# Altium footprint library BMS_V2.1_Adv.PcbLib: 66 footprints (part 5 of 5)
Each footprint in its own frame and in the unit in brackets; x right, y up, seen from the top. Pads: shape width x height; smd on the part's side, far side on the other; paste and mask are expansions set on the pad; w line width, h text height; cw(c..) or ccw(c..) is an arc to the next point about the centre after c.
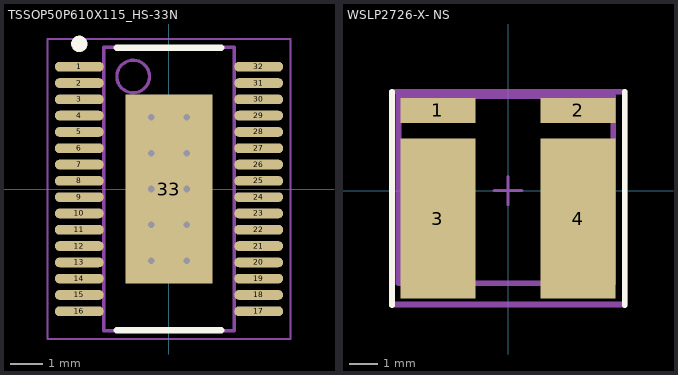
[diagram p4: the footprints below, top view; thin cyan lines are the x and y axes]

## TSSOP50P610X115_HS-33N [mm] "TSSOP, 32-Leads, Body 8.66x3.95mm, Pitch 0.50mm, Thermal Pad 5.80x2.67mm, IPC Medium Density"
height 1.15
pads (33):
  oval 1.5x0.3 smd: 1(-2.75,3.75) 2(-2.75,3.25) 3(-2.75,2.75) 4(-2.75,2.25) 5(-2.75,1.75) 6(-2.75,1.25) 7(-2.75,0.75) 8(-2.75,0.25) 9(-2.75,-0.25) 10(-2.75,-0.75) 11(-2.75,-1.25) 12(-2.75,-1.75) 13(-2.75,-2.25) 14(-2.75,-2.75) 15(-2.75,-3.25) 16(-2.75,-3.75) 17(2.75,-3.75) 18(2.75,-3.25) 19(2.75,-2.75) 20(2.75,-2.25) 21(2.75,-1.75) 22(2.75,-1.25) 23(2.75,-0.75) 24(2.75,-0.25) 25(2.75,0.25) 26(2.75,0.75) 27(2.75,1.25) 28(2.75,1.75) 29(2.75,2.25) 30(2.75,2.75) 31(2.75,3.25) 32(2.75,3.75)
  rect 2.67x5.8 smd: 33(0,0)
via 0.55,-2.2 diameter 0.5 hole 0.2
via -0.55,-2.2 diameter 0.5 hole 0.2
via 0.55,-1.1 diameter 0.5 hole 0.2
via -0.55,-1.1 diameter 0.5 hole 0.2
via 0.55,0 diameter 0.5 hole 0.2
via -0.55,0 diameter 0.5 hole 0.2
via 0.55,1.1 diameter 0.5 hole 0.2
via -0.55,1.1 diameter 0.5 hole 0.2
via 0.55,2.2 diameter 0.5 hole 0.2
via -0.55,2.2 diameter 0.5 hole 0.2
Top Overlay:
  circle w0.25: c-2.75,4.45 r0.125
  lines w0.2: -1.6,-4.325 1.6,-4.325 ; -1.6,4.325 1.6,4.325
Mechanical 13:
  circle w0.1: c-1.1,3.45 r0.5
  lines w0.1: -2,-4.35 2,-4.35 2,4.35 -2,4.35 -2,-4.35
  text ".Designator" at -1.524,0 h0.69
Mechanical 15:
  lines w0.05: -3.725,-4.6 3.725,-4.6 3.725,4.6 -3.725,4.6 -3.725,-4.6
  lines w0.1: -0.5,0 0.5,0 ; 0,-0.5 0,0.5
3D body "PG-TSDSO-32-1_Z8B00190281_V03_3D.stp": height 1.1, standoff -0.05, extent -3.001,-4.325 3,4.325

## WSLP2726-X- NS [mm] "Chip Resistor, Non Standard"
height 3.15
pads (4):
  rect 2.69x0.89 smd: 1(-2.5,2.862) 2(2.5,2.862)
  rect 2.69x5.71 smd: 3(-2.5,-1) 4(2.5,-1)
Top Overlay:
  lines w0.203: -4.14,-4.089 -4.14,3.531 ; 4.166,-4.089 4.166,3.531
Mechanical 13:
  lines w0.203: -3.912,-3.302 -3.912,3.378 3.759,3.378 3.759,-3.302 -3.912,-3.302
  text ".Designator" at 0,0 h0.69
Mechanical 15:
  lines w0.1: -0.5,0 0.5,0 ; 0,-0.5 0,0.5
  lines w0.203: -4.14,-4.064 -4.14,3.531 4.166,3.531 4.166,-4.064 -4.14,-4.064
3D body "WSLP2726 (0.0005).stp": height 2.96, standoff 0.01, extent -3.45,-3.3 3.45,3.3